# Altium footprint library ZabugorLib.PcbLib: 89 footprints (part 1 of 6)
Each footprint in its own frame and in the unit in brackets; x right, y up, seen from the top. Pads: shape width x height; smd on the part's side, far side on the other; paste and mask are expansions set on the pad; w line width, h text height; cw(c..) or ccw(c..) is an arc to the next point about the centre after c.
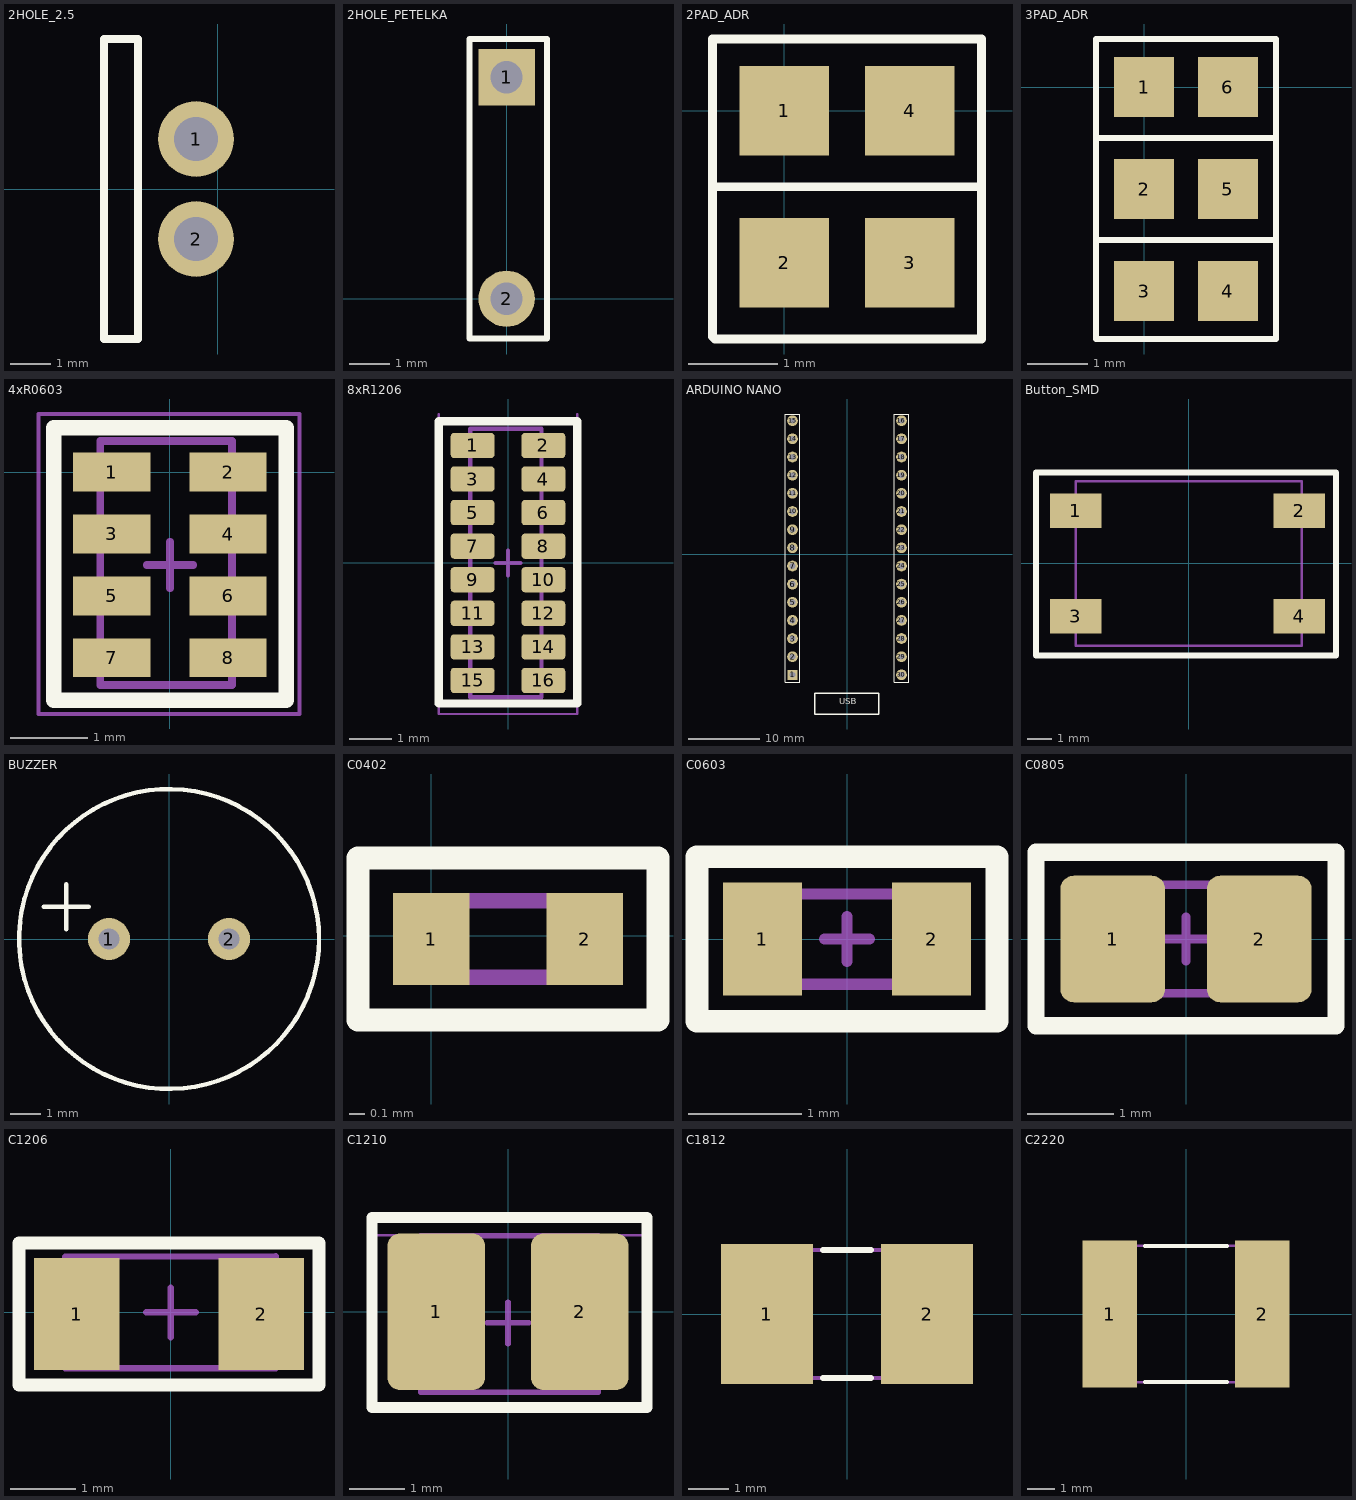
[diagram p0: the footprints below, top view; thin cyan lines are the x and y axes]

## 2HOLE_2.5 [mm]
height 0.05
pads (2):
  round 1.9 hole 1.1: 1(-0.55,1.25) 2(-0.55,-1.25)
Top Overlay:
  lines w0.2: -2.85,-3.75 -2,-3.75 -2,3.75 -2.85,3.75 -2.85,-3.75
Mechanical 11:
  lines w0.15: -2.85,-3.75 -2.85,3.75 ; -2,-3.75 -2,3.75

## 2HOLE_PETELKA [mm]
height 0.05
pads (2):
  rect 1.4x1.4 hole 0.8: 1(0,5.5)
  round 1.4 hole 0.8: 2(0,0)
Top Overlay:
  lines w0.15: -0.925,-0.99 1,-0.99 1,6.45 -0.925,6.45 -0.925,-0.99
Mechanical 7:
  lines w0.1: -0.93,-1 -0.93,3.47 ; -0.93,-0.99 1,-0.99 1,3.47 ; -0.9,6.45 0.96,6.45
Mechanical 10:
  text ".Designator" at -0.3,3.7 h0.8
  text ".Comment" at -0.7,-4.1 h0.6

## 2PAD_ADR [mm] "Перемычка для выбора адреса"
pads (4):
  rect 1x1 smd: 1(0,0) 2(0,-1.7) 3(1.4,-1.7) 4(1.4,0)
Top Overlay:
  lines w0.1: -0.8,-0.85 2.2,-0.85 ; -0.8,-2.525 -0.8,-0.5 -0.8,0.8 2.2,0.8 2.2,-2.55 -0.775,-2.55 -0.8,-2.525

## 3PAD_ADR [mm] "Перемычка для выбора адреса"
pads (6):
  rect 1x1 smd: 1(0,0) 2(0,-1.7) 3(0,-3.4) 4(1.4,-3.4) 5(1.4,-1.7) 6(1.4,0)
Top Overlay:
  lines w0.1: -0.8,-2.55 2.2,-2.55 ; -0.8,-0.85 2.2,-0.85 ; -0.8,-4.2 2.2,-4.2 2.2,0.8 -0.8,0.8 -0.8,-0.5 -0.8,-4.2

## 4xR0603 [mm]
height 0.45
pads (8):
  rect 1x0.5 smd: 1(-0.75,0) 2(0.75,0) 3(-0.75,-0.8) 4(0.75,-0.8) 5(-0.75,-1.6) 6(0.75,-1.6) 7(-0.75,-2.4) 8(0.75,-2.4)
Top Overlay:
  lines w0.2: -1.5,-2.95 -1.5,0.575 1.5,0.575 1.5,-2.95 -1.5,-2.95
Mechanical 9:
  text ".Comment" at -3.525,0.425 h0.8
  text ".Designator" at -3.525,1.025 h1
Mechanical 11:
  lines w0.1: -0.9,-2.75 -0.9,0.4 0.8,0.4 0.8,-2.75 -0.9,-2.75
Mechanical 15:
  lines w0.05: -1.7,-3.125 1.675,-3.125 1.675,0.75 -1.7,0.75 -1.7,-3.125
  lines w0.1: -0.3,-1.2 0.3,-1.2 ; 0,-1.5 0,-0.9
3D body "User Library-Array-1206-4Way-Var1.STEP": height 0.5, standoff 0, extent -0.8,-2.8 0.8,0.4

## 8xR1206 [mm]
height 0.45
pads (16):
  rrect25% 1.04x0.6 smd paste-5: 1(-0.845,2.8) 2(0.845,2.8) 3(-0.845,2) 4(0.845,2) 5(-0.845,1.2) 6(0.845,1.2) 7(-0.845,0.4) 8(0.845,0.4) 9(-0.845,-0.4) 10(0.845,-0.4) 11(-0.845,-1.2) 12(0.845,-1.2) 13(-0.845,-2) 14(0.845,-2) 15(-0.845,-2.8) 16(0.845,-2.8)
Top Overlay:
  lines w0.2: -1.65,-3.35 -1.65,3.375 1.65,3.375 1.65,-3.35 -1.65,-3.35
Top Paste:
  drawing of 16 lines, arcs and shapes, not listed
Mechanical 11:
  lines w0.1: -0.9,-3.2 -0.9,3.2 0.8,3.2 0.8,-3.2 -0.9,-3.2
Mechanical 15:
  lines w0.05: -1.65,3.375 1.65,3.375 ; -1.65,3.55 -1.65,1.7 -1.65,-3.6 1.65,-3.6 1.65,1.725 1.65,3.55
  lines w0.1: -0.3,0 0.3,0 ; 0,-0.3 0,0.3
3D body "User Library-742C163.step": height 0.53, standoff -0.03, extent -0.8,-3.2 0.8,3.2

## ARDUINO NANO [mm] "Отладочная плата"
pads (30):
  rect 1.4x1.4 hole 0.8: 1(-7.625,-16.875)
  round 1.5 hole 0.8: 2(-7.625,-14.335) 3(-7.625,-11.795) 4(-7.625,-9.255) 5(-7.625,-6.715) 6(-7.625,-4.175) 7(-7.625,-1.635) 8(-7.625,0.905) 9(-7.625,3.445) 10(-7.625,5.985) 11(-7.625,8.525) 12(-7.625,11.065) 13(-7.625,13.605) 14(-7.625,16.145) 15(-7.625,18.685) 16(7.615,18.685) 17(7.615,16.145) 18(7.615,13.605) 19(7.615,11.065) 20(7.615,8.525) 21(7.615,5.985) 22(7.615,3.445) 23(7.615,0.905) 24(7.615,-1.635) 25(7.615,-4.175) 26(7.615,-6.715) 27(7.615,-9.255) 28(7.615,-11.795) 29(7.615,-14.335) 30(7.615,-16.875)
Top Overlay:
  lines w0.1: -8.625,-17.875 -8.625,19.625 -6.625,19.625 -6.625,-17.875 -8.625,-17.875 ; 6.615,-17.875 8.615,-17.875 8.615,19.625 6.615,19.625 6.615,-17.875
  lines w0.2: -4.525,-22.3 -4.525,-19.475 4.425,-19.475 4.425,-22.35 -4.475,-22.35 -4.525,-22.3
  text "USB" at -1.075,-21.35 h1.52
3D body "User Library-arduino_nano.STEP": height 21.37, standoff -3.18, extent -9,-22.5 9,22.5

## Button_SMD [mm] "Кнопка"
pads (4):
  rect 2.1x1.4 smd: 1(-4.6,2.15) 2(4.5,2.15) 3(-4.6,-2.15) 4(4.5,-2.15)
Top Overlay:
  lines w0.254: -6.225,3.7 -6.225,-3.75 -3.175,-3.75 2.925,-3.75 6,-3.75 6,3.675 ; -6.2,3.7 -3,3.7 2.8,3.7 3.863,3.7 5.088,3.7 6,3.7
Mechanical 7:
  lines w0.1: -4.6,-3.35 4.6,-3.35 4.6,3.35 -4.6,3.35 -4.6,-3.35
3D body "User Library-PTS645SL70SMTR92-LFS.STEP": height 7, standoff 0, extent -4.5,-3 4.5,3

## BUZZER [mm] "Пьезоизлучатель звуковой"
pads (2):
  round 1.4 hole 0.7: 1(-2,0) 2(2,0)
Top Overlay:
  circle w0.15: c0,0 r5
  lines w0.15: -4.175,1.075 -2.675,1.075 ; -3.425,0.325 -3.425,0.575 -3.425,1.825
3D body "User Library-Buzzer_9mm.STEP": height 6.9, standoff -4.1, extent -4.6,-4.65 4.5,4.45

## C0402 [mm]
pads (2):
  rect 0.5x0.6 smd: 1(0,-0.02) 2(1,-0.02)
Top Overlay:
  lines w0.15: -0.48,-0.55 1.48,-0.55 1.48,0.51 -0.48,0.51 -0.48,-0.55
Mechanical 7:
  lines w0.1: 0,-0.27 0,0.23 1,0.23 1,-0.27 0,-0.27
Mechanical 10:
  text ".Comment" at -0.08,-1.13 h0.6
  text ".Designator" at -0.08,0.73 h0.8
3D body "User Library-C0402-1.step": height 0.48, standoff -0.01, extent 0.01,-0.254 1.006,0.246

## C0603 [mm]
height 0.9
pads (2):
  rect 0.7x1 smd: 1(-0.75,0) 2(0.75,0)
Top Overlay:
  lines w0.2: -1.33,-0.73 -1.33,0.73 1.33,0.73 1.33,-0.73 -1.33,-0.73
Mechanical 9:
  text ".Comment" at -0.75,-0.5 h0.8
  text ".Designator" at -0.75,0 h1
Mechanical 11:
  lines w0.1: -0.8,-0.4 0.8,-0.4 0.8,0.4 -0.8,0.4 -0.8,-0.4
Mechanical 15:
  lines w0.05: 0,0.725 -1.325,0.725 ; -1.325,0.725 -1.325,-0.725 1.325,-0.725 1.325,0.725 -1.325,0.725
  lines w0.1: -0.2,0 0.2,0 ; 0,-0.2 0,0.2
3D body "CAPC0603.STEP": height 0.9, standoff 0, extent -0.8,-0.4 0.8,0.4

## C0805 [mm]
height 1.3
pads (2):
  rrect25% 1.21x1.46 smd paste-5: 1(-0.845,0) 2(0.845,0)
Top Overlay:
  lines w0.2: -1.73,-1 -1.73,1 1.73,1 1.73,-1 -1.73,-1
Top Paste:
  region: 1.3,0.73 0.39,0.73 0.36,0.73 0.305,0.707 0.263,0.665 0.24,0.61 0.24,0.58 0.48,0 0.24,-0.58 0.24,-0.61 0.263,-0.665 0.305,-0.707 0.36,-0.73 0.39,-0.73 1.3,-0.73 1.33,-0.73 1.385,-0.707 1.427,-0.665 1.45,-0.61 1.45,-0.58 1.45,0.58 1.45,0.61 1.427,0.665 1.385,0.707 1.33,0.73
  region: -1.3,0.73 -0.39,0.73 -0.36,0.73 -0.305,0.707 -0.263,0.665 -0.24,0.61 -0.24,0.58 -0.48,0 -0.24,-0.58 -0.24,-0.61 -0.263,-0.665 -0.305,-0.707 -0.36,-0.73 -0.39,-0.73 -1.3,-0.73 -1.33,-0.73 -1.385,-0.707 -1.427,-0.665 -1.45,-0.61 -1.45,-0.58 -1.45,0.58 -1.45,0.61 -1.427,0.665 -1.385,0.707 -1.33,0.73
Mechanical 9:
  text ".Comment" at -0.75,-0.5 h0.8
  text ".Designator" at -0.75,0.25 h1
Mechanical 11:
  lines w0.1: -1,-0.625 1,-0.625 1,0.625 -1,0.625 -1,-0.625
Mechanical 15:
  lines w0.05: -1.73,-0.93 1.73,-0.93 1.73,0.93 -1.73,0.93 -1.73,-0.93
  lines w0.1: -0.254,0 0.254,0 ; 0,-0.254 0,0.254
3D body "CAP0805.STEP": height 0.78, standoff 0, extent -1,-0.625 1,0.625

## C1206 [mm]
height 1.5
pads (2):
  rect 1.3x1.7 smd: 1(-1.428,-0.024) 2(1.372,-0.024)
Top Overlay:
  lines w0.2: -2.308,-1.104 -2.308,1.056 2.252,1.056 2.252,-1.104 -2.308,-1.104
Mechanical 9:
  text ".Designator" at -1,0.25 h1
  text ".Comment" at -1,-0.5 h0.8
Mechanical 11:
  lines w0.1: -1.603,-0.849 1.597,-0.849 1.597,0.851 -1.603,0.849 -1.603,-0.849
Mechanical 15:
  lines w0.05: 0,1.05 -2.3,1.05 ; -2.3,1.05 2.25,1.05 2.25,-1.1 -2.3,-1.1 -2.3,1.05
  lines w0.1: -0.375,0 0.375,0 ; 0,-0.375 0,0.375
3D body "SMD_1206.step": height 1.75, standoff 0.25, extent -1.603,-0.849 1.597,0.851

## C1210 [mm]
height 2.5
pads (2):
  rrect25% 1.76x2.82 smd paste-5: 1(-1.295,0) 2(1.295,0)
Top Overlay:
  lines w0.2: -2.455,-1.725 2.505,-1.725 2.505,1.7 -2.455,1.7 -2.455,-1.725
Top Paste:
  region: 1.96,1.41 0.635,1.41 0.591,1.41 0.51,1.376 0.449,1.315 0.415,1.234 0.415,1.19 0.765,-0.01 0.415,-1.195 0.415,-1.238 0.448,-1.317 0.508,-1.377 0.587,-1.41 0.63,-1.41 1.955,-1.41 1.999,-1.41 2.08,-1.376 2.141,-1.315 2.175,-1.234 2.175,-1.19 2.175,1.195 2.175,1.238 2.142,1.317 2.082,1.377 2.003,1.41
  region: -1.96,1.41 -0.635,1.41 -0.591,1.41 -0.51,1.376 -0.449,1.315 -0.415,1.234 -0.415,1.19 -0.765,-0.01 -0.415,-1.195 -0.415,-1.238 -0.448,-1.317 -0.508,-1.377 -0.587,-1.41 -0.63,-1.41 -1.955,-1.41 -1.999,-1.41 -2.08,-1.376 -2.141,-1.315 -2.175,-1.234 -2.175,-1.19 -2.175,1.195 -2.175,1.238 -2.142,1.317 -2.082,1.377 -2.003,1.41
Mechanical 9:
  text ".Designator" at -1.25,0 h1
  text ".Comment" at -1.25,-0.75 h0.8
Mechanical 11:
  lines w0.1: -1.575,-1.45 -1.575,1.375 1.625,1.375 1.625,-1.45 -1.575,-1.45
Mechanical 15:
  lines w0.05: -2.455,-1.78 -2.455,1.38 2.505,1.38 2.505,-1.78 -2.455,-1.78
  lines w0.1: -0.375,-0.2 0.375,-0.2 ; 0,-0.575 0,0.175
3D body "SMD_1210.step": height 1.65, standoff -0.05, extent -1.625,-1.275 1.575,1.225

## C1812 [mm]
height 1.7
pads (2):
  rect 2.3x3.5 smd: 1(-2,0) 2(2,0)
Top Overlay:
  lines w0.15: -0.6,-1.6 0.6,-1.6 ; -0.6,1.6 0.6,1.6
Mechanical 7:
  lines w0.1: -2.25,-1.6 2.25,-1.6 2.25,1.6 -2.25,1.6 -2.25,-1.6
Mechanical 10:
  text ".Designator" at -0.62,2.14 h0.8
  text ".Comment" at -0.63,-2.52 h0.6
3D body "User Library-CAPC4532X13.step": height 1.3, standoff 0, extent -2.25,-1.6 2.25,1.6

## C2220 [mm]
height 1.8
pads (2):
  rect 2x5.4 smd: 1(-2.8,0) 2(2.8,0)
Top Overlay:
  lines w0.15: -1.5,-2.5 1.5,-2.5 ; -1.5,2.5 1.5,2.5
Mechanical 7:
  lines w0.1: -2.8,-2.5 2.8,-2.5 2.8,2.5 -2.8,2.5 -2.8,-2.5
Mechanical 10:
  text ".Comment" at -0.47,-3.45 h0.6
  text ".Designator" at -0.56,3.04 h0.8
3D body "User Library-CAPC5750X23.step": height 2.3, standoff 0, extent -2.85,-2.5 2.85,2.5